# Altium footprint library 常用元件封装库.PcbLib: 1310 footprints (part 76 of 83)
Each footprint in its own frame and in the unit in brackets; x right, y up, seen from the top. Pads: shape width x height; smd on the part's side, far side on the other; paste and mask are expansions set on the pad; w line width, h text height; cw(c..) or ccw(c..) is an arc to the next point about the centre after c.
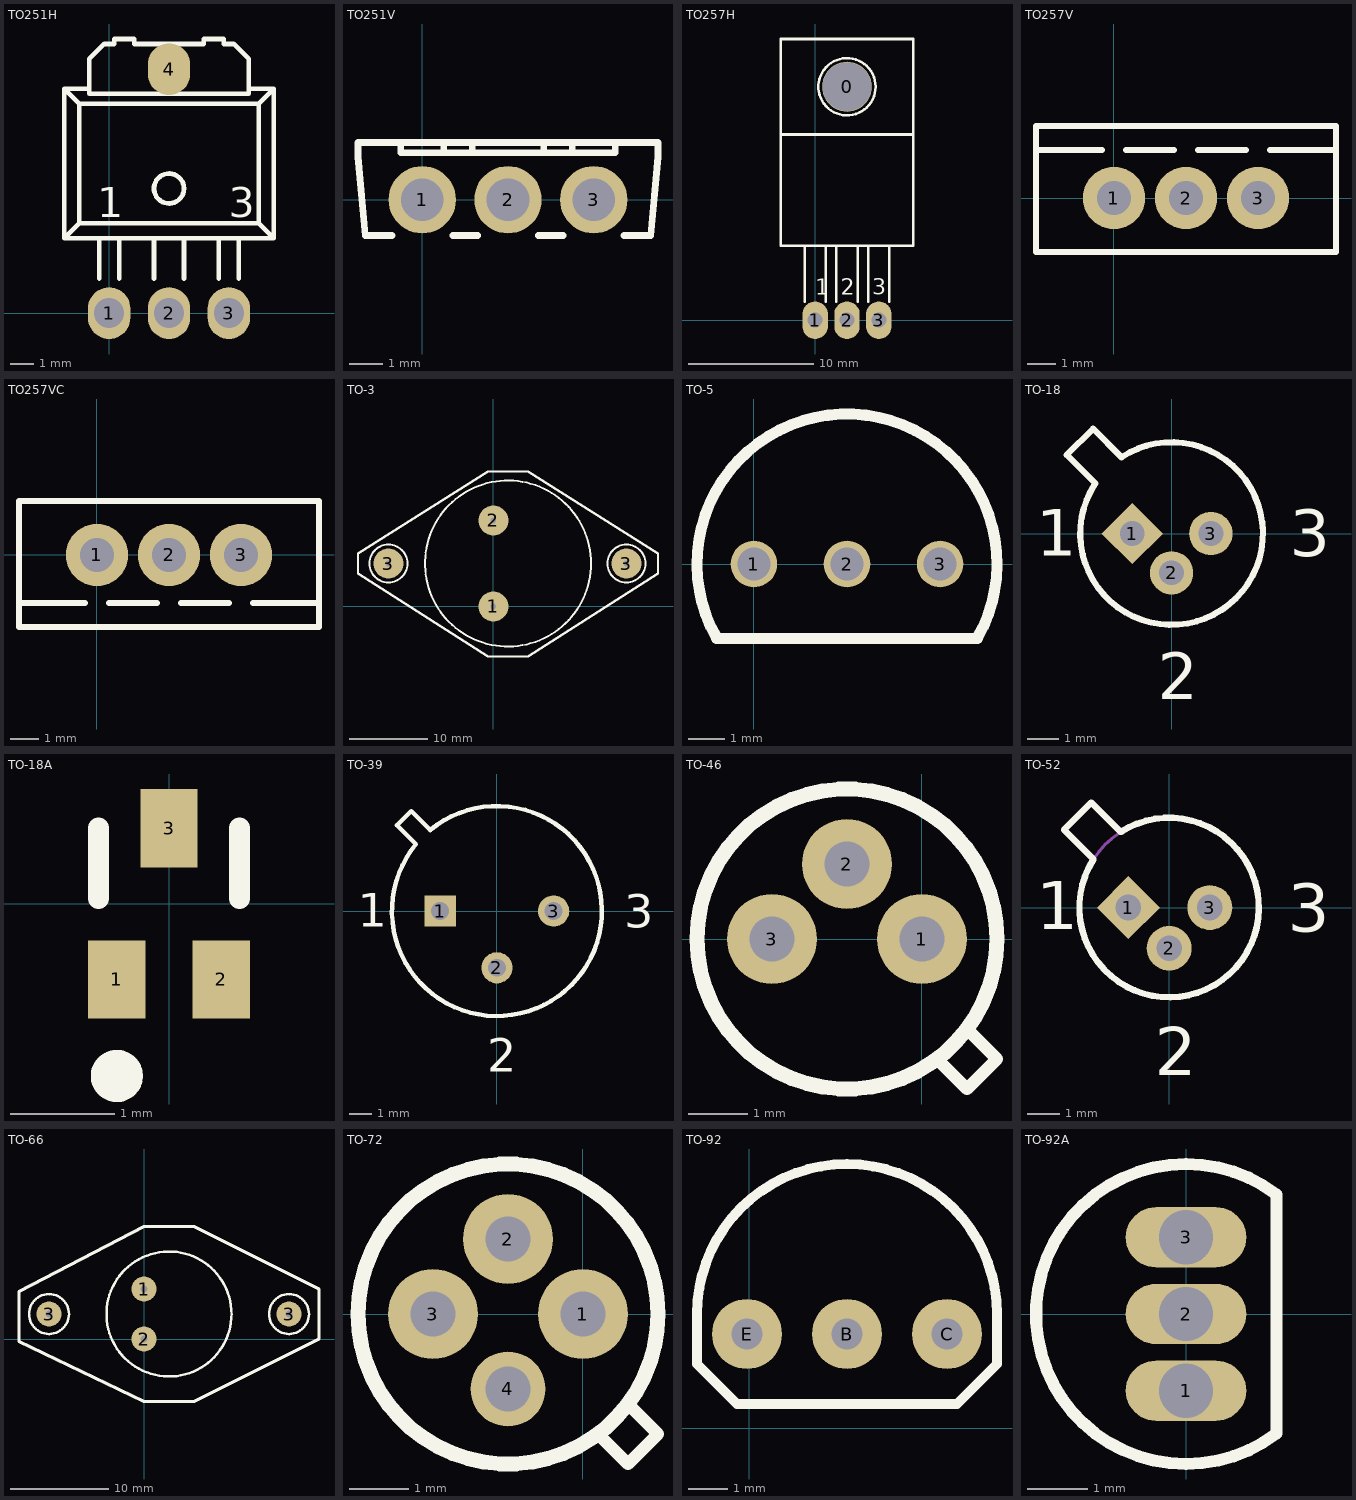
[diagram p75: the footprints below, top view; thin cyan lines are the x and y axes]

## TO251H [mm]
pads (4):
  oval 1.8x2.2 hole 1.27: 1(0,0) 2(2.54,0) 3(5.08,0)
  oval 1.8x2.2 smd: 4(2.54,10.363)
Top Overlay:
  circle w0.203: c2.54,5.292 r0.635
  lines w0.2: -0.847,9.525 -1.905,9.525 ; -0.423,1.47 -0.423,3.175 ; 0.423,1.47 0.423,3.175 ; 1.905,1.47 1.905,3.175 ; 3.175,1.47 3.175,3.175 ; 4.657,1.47 4.657,3.175 ; 5.503,1.47 5.503,3.175 ; 5.927,9.525 6.985,9.525 ; -1.905,3.175 -1.27,3.81 ; -1.905,3.175 -1.905,9.525 ; -1.905,3.175 6.985,3.175 ; -1.905,9.525 -1.27,8.89 ; -1.27,3.81 6.35,3.81 ; -1.27,3.81 -1.27,8.89 ; -1.27,8.89 6.35,8.89 ; 6.35,3.81 6.985,3.175 ; 6.35,3.81 6.35,8.89 ; 6.35,8.89 6.985,9.525 ; 6.985,3.175 6.985,9.525 ; -0.847,9.313 5.927,9.313 5.927,10.795 5.292,11.43 4.868,11.43 4.868,11.642 4.022,11.642 4.022,11.43 1.058,11.43 1.058,11.642 0.212,11.642 0.212,11.43 -0.212,11.43 -0.847,10.795 -0.847,9.313
  text "3" at 5.08,4.064 h1.27
  text "1" at -0.508,4.064 h1.27

## TO251V [mm]
pads (3):
  round 2 hole 1.27: 1(0,0) 2(2.54,0) 3(5.08,0)
Top Overlay:
  lines w0.2: -0.9,-1.058 -1.693,-1.058 -1.905,1.27 -1.905,1.482 -1.905,1.693 6.985,1.693 6.985,1.27 6.773,-1.058 5.98,-1.058 ; -0.635,1.693 -0.635,1.389 5.715,1.389 5.715,1.693 ; 0.635,1.389 0.635,1.693 ; 0.9,-1.058 1.64,-1.058 ; 1.482,1.389 1.482,1.693 ; 3.44,-1.058 4.18,-1.058 ; 3.598,1.389 3.598,1.693 ; 4.445,1.389 4.445,1.693

## TO257H [mm]
pads (4):
  oval 3.937x4 hole 3.9: 0(2.54,18.627)
  oval 2.032x3 hole 1.2: 1(0,0) 2(2.54,0) 3(5.08,0)
Top Overlay:
  circle w0.203: c2.54,18.627 r2.286
  lines w0.2: -2.752,14.817 7.832,14.817 ; -0.847,1.482 -0.847,5.927 ; 0.847,1.482 0.847,5.927 ; 1.693,1.482 1.693,5.927 ; 3.387,1.482 3.387,5.927 ; 4.233,1.482 4.233,5.927 ; 5.927,1.482 5.927,5.927 ; -2.752,5.927 7.832,5.927 7.832,22.437 -2.752,22.437 -2.752,5.927
  text "1" at 0,2.032 h1.27
  text "2" at 2.032,2.032 h1.27
  text "3" at 4.572,2.032 h1.27

## TO257V [mm]
pads (3):
  round 2.2 hole 1.2: 1(0,0) 2(2.54,0) 3(5.08,0)
Top Overlay:
  lines w0.2: -2.752,1.693 -0.423,1.693 ; 0.423,1.693 2.117,1.693 ; 2.963,1.693 4.657,1.693 ; 5.503,1.693 7.832,1.693 ; -2.752,-1.905 -2.752,2.54 7.832,2.54 7.832,-1.905 -2.752,-1.905

## TO257VC [mm]
pads (3):
  round 2.2 hole 1.2: 1(0,0) 2(2.54,0) 3(5.08,0)
Top Overlay:
  lines w0.2: -2.752,-1.693 -0.423,-1.693 ; 0.423,-1.693 2.117,-1.693 ; 2.963,-1.693 4.657,-1.693 ; 5.503,-1.693 7.832,-1.693 ; -2.752,-2.54 7.832,-2.54 7.832,1.905 -2.752,1.905 -2.752,-2.54

## TO-3 [mil]
pads (4):
  round 150 hole 28: 1(0,0) 2(0,430) 3(-525,215) 3(665,215)
Top Overlay:
  circle w10: c73,215 r415
  circle w10: c665,215 r95
  circle w10: c-525,215 r95
  lines w12: -677,165 -27,-250 173,-250 823,165 823,265 173,675 -27,675 -677,265 -677,165

## TO-5 [mm]
pads (3):
  round 1.27 hole 0.9: 1(0,0) 2(2.54,0) 3(5.08,0)
Top Overlay:
  lines w0.305: -1.016,-2.032 cw(c2.54,0) 6.096,-2.032 -1.016,-2.032

## TO-18 [mm] "Can; 3 Leads; Pin Circle Dia. 2.54 mm; Lead Dia. 0.48 mm (max)"
height 5.33
pads (3):
  rect 1.4x1.4 hole 0.8 rot 45: 1(-1.27,0)
  round 1.4 hole 0.8: 2(0,-1.27) 3(1.27,0)
Top Overlay:
  lines w0.2: -3.386,2.537 -2.467,1.618 ccw(c0,0) -1.618,2.467 -2.537,3.386 -3.386,2.537
  text "3" at 3.812,-0.742 h1.5
  text "2" at -0.443,-5.355 h1.5
  text "1" at -4.38,-0.719 h1.5

## TO-18A [mm] "SC-89; 3 Flat Leads; Body 1.6 x 1.6 x 0.7 mm, inc leads (LxWxH typ)"
height 0.8
pads (3):
  rect 0.55x0.75 smd: 1(-0.5,-0.725) 2(0.5,-0.725) 3(0,0.725)
Top Overlay:
  circle w0.25: c-0.5,-1.65 r0.125
  lines w0.2: -0.676,0.05 -0.676,0.725 ; 0.675,0.05 0.675,0.725

## TO-39 [mm] "Can; 3 Leads; Pin Circle Dia. 5.08 mm; Lead Dia. 0.48 mm (max)"
height 4.55
pads (3):
  rect 1.4x1.4 hole 0.8: 1(-2.54,0)
  round 1.4 hole 0.8: 2(0,-2.54) 3(2.54,0)
Top Overlay:
  lines w0.2: -4.475,3.838 -3.626,2.99 ccw(c0,0) -2.99,3.626 -3.838,4.475 -4.475,3.838
  text "1" at -6.219,-0.697 h1.5
  text "2" at -0.433,-7.203 h1.5
  text "3" at 5.712,-0.751 h1.5

## TO-46 [mil]
pads (3):
  round 60 hole 30: 1(0,0) 2(-50,50) 3(-100,0)
Top Overlay:
  circle w10: c-50,0 r100
  lines w8: 10,-80 30,-100 50,-80 30,-60

## TO-52 [mm] "Can; 3 Leads; Pin Circle Dia. 2.54 mm"
height 2.67
pads (3):
  rect 1.4x1.4 hole 0.8 rot 45: 1(-1.27,0)
  round 1.4 hole 0.8: 2(0,-1.27) 3(1.27,0)
Top Overlay:
  lines w0.2: -3.277,2.429 -2.429,3.277 -1.51,2.358 cw(c0,0) -2.358,1.51 -3.277,2.429
  text "1" at -4.153,-0.68 h1.5
  text "2" at -0.442,-5.239 h1.5
  text "3" at 3.706,-0.751 h1.5
Mechanical 1:
  circle w0.1: c0,0 r2.8

## TO-66 [mil]
pads (4):
  round 100 hole 28: 1(0,200) 2(0,0) 3(-380,100) 3(580,100)
Top Overlay:
  circle w10: c580,100 r80
  circle w10: c-380,100 r80
  circle w10: c100,100 r250
  lines w12: -500,-10 0,-250 200,-250 700,0 700,200 200,450 0,450 -500,190 -500,-10

## TO-72 [mil]
pads (4):
  round 60 hole 30: 1(0,0) 2(-50,50) 3(-100,0)
  round 50 hole 30: 4(-50,-50)
Top Overlay:
  circle w10: c-50,0 r100
  lines w8: 10,-80 30,-100 50,-80 30,-60

## TO-92 [mil]
pads (3):
  round 70 hole 31.5: B(98,94) C(198,94) E(-2,94)
Top Overlay:
  lines w10: -52,64 -52,114 cw(c98,114) 248,114 248,64 208,24 -12,24 -52,64

## TO-92A [mm]
height 6.86
pads (3):
  oval 2x1 hole 0.9: 1(0,-1.27) 2(0,0) 3(0,1.27)
Top Overlay:
  lines w0.2: 1.5,-1.98 cw(c0,0) 1.5,1.98 1.5,-1.98